# Altium footprint library UP-ROBOT Connectors(2013-02-26).PcbLib: 121 footprints (part 4 of 8)
Each footprint in its own frame and in the unit in brackets; x right, y up, seen from the top. Pads: shape width x height; smd on the part's side, far side on the other; paste and mask are expansions set on the pad; w line width, h text height; cw(c..) or ccw(c..) is an arc to the next point about the centre after c.
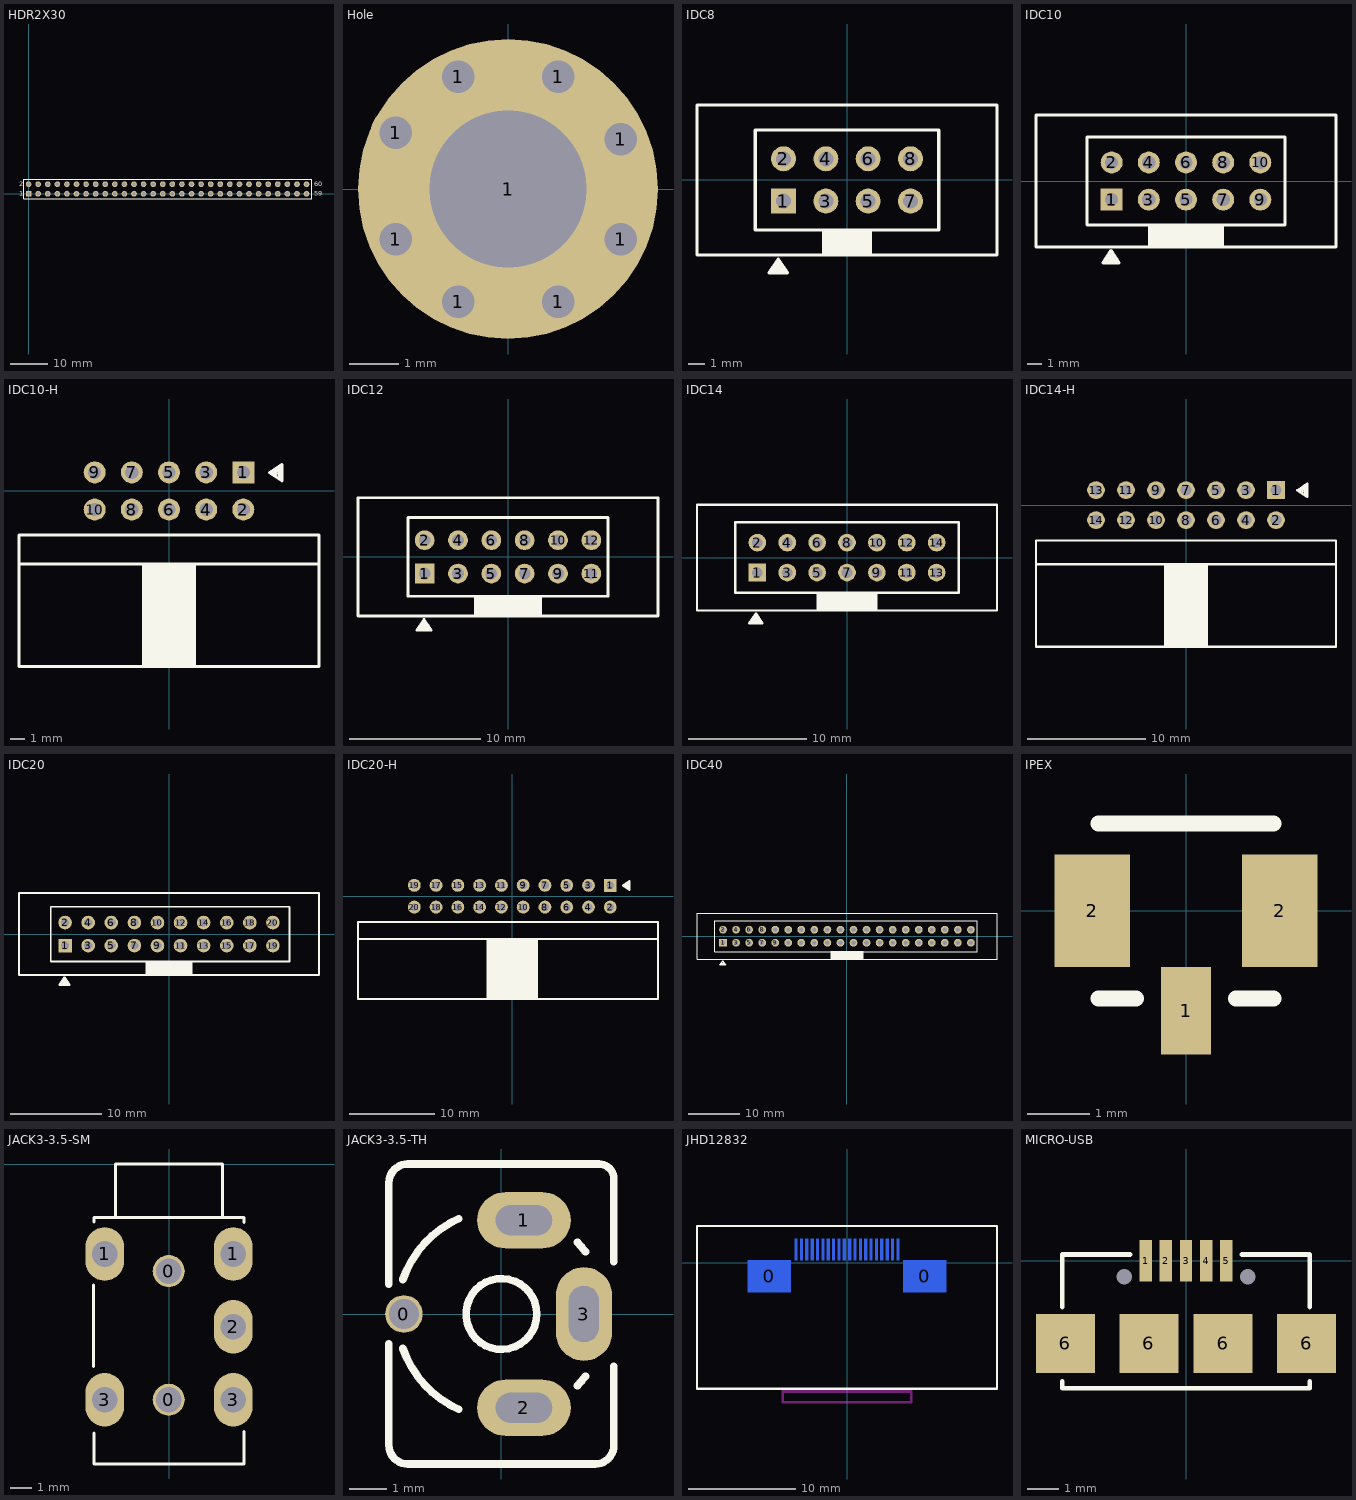
[diagram p3: the footprints below, top view; thin cyan lines are the x and y axes]

## HDR2X30 [mm]
pads (60):
  rect 1.5x1.5 hole 0.9: 1(0,0)
  round 1.5 hole 0.9: 2(0,2.54) 3(2.54,0) 4(2.54,2.54) 5(5.08,0) 6(5.08,2.54) 7(7.62,0) 8(7.62,2.54) 9(10.16,0) 10(10.16,2.54) 11(12.7,0) 12(12.7,2.54) 13(15.24,0) 14(15.24,2.54) 15(17.78,0) 16(17.78,2.54) 17(20.32,0) 18(20.32,2.54) 19(22.86,0) 20(22.86,2.54) 21(25.4,0) 22(25.4,2.54) 23(27.94,0) 24(27.94,2.54) 25(30.48,0) 26(30.48,2.54) 27(33.02,0) 28(33.02,2.54) 29(35.56,0) 30(35.56,2.54) 31(38.1,0) 32(38.1,2.54) 33(40.64,0) 34(40.64,2.54) 35(43.18,0) 36(43.18,2.54) 37(45.72,0) 38(45.72,2.54) 39(48.26,0) 40(48.26,2.54) 41(50.8,0) 42(50.8,2.54) 43(53.34,0) 44(53.34,2.54) 45(55.88,0) 46(55.88,2.54) 47(58.42,0) 48(58.42,2.54) 49(60.96,0) 50(60.96,2.54) 51(63.5,0) 52(63.5,2.54) 53(66.04,0) 54(66.04,2.54) 55(68.58,0) 56(68.58,2.54) 57(71.12,0) 58(71.12,2.54) 59(73.66,0) 60(73.66,2.54)
Top Overlay:
  lines w0.2: -1.27,-1.27 -1.27,3.81 75.06,3.81 75.06,-1.27 -1.27,-1.27
  text "2" at -2.54,2.032 h1.27
  text "1" at -2.54,-0.508 h1.27
  text "59" at 75.692,-0.508 h1.27
  text "60" at 75.692,2.032 h1.27

## Hole [mil]
pads (9):
  round 40 hole 26: 1(-90,-40) 1(-90,45) 1(-40,-90) 1(-40,90) 1(40,-90) 1(40,90) 1(90,-40) 1(90,40)
  round 240 hole 125.98: 1(0,0)

## IDC8 [mm]
pads (8):
  rect 1.5x1.5 hole 0.9: 1(-3.81,-1.27)
  round 1.5 hole 0.9: 2(-3.81,1.27) 3(-1.27,-1.27) 4(-1.27,1.27) 5(1.27,-1.27) 6(1.27,1.27) 7(3.81,-1.27) 8(3.81,1.27)
Top Overlay:
  rectangle: -1.5,-4.5 1.5,-3
  lines w0.203: -4.564,-5.408 -3.694,-5.396 ; -4.426,-5.201 -3.811,-5.22 ; -4.19,-5.209 -4.08,-4.963 ; -4.028,-5.214 -4.125,-4.75 ; -4.125,-4.75 -4.683,-5.587 -3.567,-5.587 -4.125,-4.75 ; -9,-4.5 -2.5,-4.5 2.5,-4.5 9,-4.5 9,4.5 -9,4.5 -9,-4.5 ; -5.5,-3 -5.5,3 5.5,3 5.5,-3 2.5,-3 -2.5,-3 -5.5,-3
3D body: height 8.36, standoff -3.81, extent -8.9,-4.45 8.94,4.55

## IDC10 [mm]
pads (10):
  rect 1.5x1.5 hole 0.9: 1(-5.08,-1.27)
  round 1.5 hole 0.9: 2(-5.08,1.27) 3(-2.54,-1.27) 4(-2.54,1.27) 5(0,-1.27) 6(0,1.27) 7(2.54,-1.27) 8(2.54,1.27) 9(5.08,-1.27) 10(5.08,1.27)
Top Overlay:
  rectangle: -2.5,-4.5 2.5,-3
  lines w0.203: -5.564,-5.408 -4.694,-5.396 ; -5.426,-5.201 -4.811,-5.22 ; -5.19,-5.209 -5.08,-4.963 ; -5.028,-5.214 -5.125,-4.75 ; -5.125,-4.75 -5.683,-5.587 -4.567,-5.587 -5.125,-4.75 ; -2.5,-4.5 -2.5,-3 ; -2.5,-4.5 -10.25,-4.5 -10.25,4.5 10.25,4.5 10.25,-4.5 2.5,-4.5 ; -2.5,-4.5 2.5,-4.5 ; -2.5,-3 -6.75,-3 -6.75,3 6.75,3 6.75,-3 2.5,-3 ; -2.5,-3 2.5,-3 ; 2.5,-4.5 2.5,-3
3D body: height 8.36, standoff -2.2, extent -10.25,-4.5 10.13,4.5

## IDC10-H [mm]
pads (10):
  rect 1.5x1.5 hole 0.9: 1(5.08,1.27)
  round 1.5 hole 0.9: 2(5.08,-1.27) 3(2.54,1.27) 4(2.54,-1.27) 5(0,1.27) 6(0,-1.27) 7(-2.54,1.27) 8(-2.54,-1.27) 9(-5.08,1.27) 10(-5.08,-1.27)
Top Overlay:
  rectangle: -1.75,-12 1.75,-5
  lines w0.203: -10.25,-5 10.25,-5 ; -1.75,-12 -1.75,-5 1.75,-5 1.75,-12 ; 7.088,1.295 7.334,1.185 ; 7.326,0.949 7.345,1.564 ; 7.339,1.347 6.875,1.25 ; 7.521,1.681 7.533,0.811 ; 6.875,1.25 7.712,1.808 7.712,0.692 6.875,1.25 ; -10.25,-12 -10.25,-3 10.25,-3 10.25,-12 0,-12 -10.25,-12
3D body: height 9, standoff -2.41, extent -10.19,-12 10.19,1.6

## IDC12 [mm]
pads (12):
  rect 1.5x1.5 hole 0.9: 1(-6.35,-1.27)
  round 1.5 hole 0.9: 2(-6.35,1.27) 3(-3.81,-1.27) 4(-3.81,1.27) 5(-1.27,-1.27) 6(-1.27,1.27) 7(1.27,-1.27) 8(1.27,1.27) 9(3.81,-1.27) 10(3.81,1.27) 11(6.35,-1.27) 12(6.35,1.27)
Top Overlay:
  rectangle: -2.5,-4.5 2.5,-3
  lines w0.203: -6.834,-5.408 -5.964,-5.396 ; -6.696,-5.201 -6.081,-5.22 ; -6.46,-5.209 -6.35,-4.963 ; -6.298,-5.214 -6.395,-4.75 ; -6.395,-4.75 -5.837,-5.587 -6.953,-5.587 -6.395,-4.75 ; -2.5,-4.5 -2.5,-3 ; -2.5,-4.5 -11.43,-4.5 -11.43,4.5 11.43,4.5 11.43,-4.5 2.5,-4.5 ; -2.5,-4.5 2.5,-4.5 ; -2.5,-3 -7.62,-3 -7.62,3 7.62,3 7.62,-3 2.5,-3 ; -2.5,-3 2.5,-3 ; 2.5,-4.5 2.5,-3
3D body: height 8.36, standoff -2.2, extent -11.45,-4.5 11.47,4.5

## IDC14 [mm]
pads (14):
  rect 1.5x1.5 hole 0.9: 1(-7.62,-1.27)
  round 1.5 hole 0.9: 2(-7.62,1.27) 3(-5.08,-1.27) 4(-5.08,1.27) 5(-2.54,-1.27) 6(-2.54,1.27) 7(0,-1.27) 8(0,1.27) 9(2.54,-1.27) 10(2.54,1.27) 11(5.08,-1.27) 12(5.08,1.27) 13(7.62,-1.27) 14(7.62,1.27)
Top Overlay:
  rectangle: -2.5,-4.5 2.5,-3
  lines w0.203: -8.189,-5.408 -7.319,-5.396 ; -8.051,-5.201 -7.436,-5.22 ; -7.815,-5.209 -7.705,-4.963 ; -7.653,-5.214 -7.75,-4.75 ; -7.75,-4.75 -7.192,-5.587 -8.308,-5.587 -7.75,-4.75 ; -2.5,-4.5 2.5,-4.5 ; -2.5,-4.5 -12.75,-4.5 -12.75,4.5 12.75,4.5 12.75,-4.5 2.5,-4.5 ; -2.5,-4.5 -2.5,-3 ; -2.5,-3 2.5,-3 ; -2.5,-3 -9.5,-3 -9.5,3 9.5,3 9.5,-3 2.5,-3 ; 2.5,-4.5 2.5,-3
3D body: height 10.8, standoff -3.81, extent -12.75,-4.45 12.65,4.55

## IDC14-H [mm]
pads (14):
  rect 1.5x1.5 hole 0.9: 1(7.62,1.27)
  round 1.5 hole 0.9: 2(7.62,-1.27) 3(5.08,1.27) 4(5.08,-1.27) 5(2.54,1.27) 6(2.54,-1.27) 7(0,1.27) 8(0,-1.27) 9(-2.54,1.27) 10(-2.54,-1.27) 11(-5.08,1.27) 12(-5.08,-1.27) 13(-7.62,1.27) 14(-7.62,-1.27)
Top Overlay:
  rectangle: -1.75,-12 1.75,-5
  lines w0.203: -12.7,-5 12.7,-5 ; -1.75,-12 -1.75,-5 1.75,-5 1.75,-12 ; 9.628,1.295 9.874,1.185 ; 9.866,0.949 9.885,1.564 ; 9.879,1.347 9.415,1.25 ; 10.061,1.681 10.073,0.811 ; 9.415,1.25 10.252,0.692 10.252,1.808 9.415,1.25 ; -12.7,-12 -12.7,-3 12.7,-3 12.7,-12 0,-12 -12.7,-12

## IDC20 [mm]
pads (20):
  rect 1.5x1.5 hole 0.9: 1(-11.43,-1.27)
  round 1.5 hole 0.9: 2(-11.43,1.27) 3(-8.89,-1.27) 4(-8.89,1.27) 5(-6.35,-1.27) 6(-6.35,1.27) 7(-3.81,-1.27) 8(-3.81,1.27) 9(-1.27,-1.27) 10(-1.27,1.27) 11(1.27,-1.27) 12(1.27,1.27) 13(3.81,-1.27) 14(3.81,1.27) 15(6.35,-1.27) 16(6.35,1.27) 17(8.89,-1.27) 18(8.89,1.27) 19(11.43,-1.27) 20(11.43,1.27)
Top Overlay:
  rectangle: -2.5,-4.5 2.5,-3
  lines w0.203: -11.939,-5.408 -11.069,-5.396 ; -11.801,-5.201 -11.186,-5.22 ; -11.565,-5.209 -11.455,-4.963 ; -11.411,-5.176 -11.5,-4.75 ; -11.5,-4.75 -10.942,-5.587 -12.058,-5.587 -11.5,-4.75 ; -2.5,-4.5 2.5,-4.5 ; -2.5,-4.5 -16.5,-4.5 -16.5,4.5 16.5,4.5 16.5,-4.5 2.5,-4.5 ; -2.5,-4.5 -2.5,-3 ; -2.5,-3 2.5,-3 ; -2.5,-3 -13,-3 -13,3 13.25,3 13.25,-3 2.5,-3 ; 2.5,-4.5 2.5,-3
3D body: height 8.36, standoff -2.2, extent -16.54,-4.5 16.54,4.5

## IDC20-H [mm]
pads (20):
  rect 1.5x1.5 hole 0.9: 1(11.43,1.27)
  round 1.5 hole 0.9: 2(11.43,-1.27) 3(8.89,1.27) 4(8.89,-1.27) 5(6.35,1.27) 6(6.35,-1.27) 7(3.81,1.27) 8(3.81,-1.27) 9(1.27,1.27) 10(1.27,-1.27) 11(-1.27,1.27) 12(-1.27,-1.27) 13(-3.81,1.27) 14(-3.81,-1.27) 15(-6.35,1.27) 16(-6.35,-1.27) 17(-8.89,1.27) 18(-8.89,-1.27) 19(-11.43,1.27) 20(-11.43,-1.27)
Top Overlay:
  rectangle: -3,-12 3,-5
  lines w0.203: -18,-5 17,-5 ; -1.75,-12 -1.75,-5 1.75,-5 1.75,-12 ; 13.088,1.295 13.334,1.185 ; 13.326,0.949 13.345,1.564 ; 13.339,1.347 12.875,1.25 ; 13.521,1.681 13.533,0.811 ; 12.875,1.25 13.712,1.808 13.712,0.692 12.875,1.25 ; -18,-12 -18,-3 17,-3 17,-12 0,-12 -18,-12

## IDC40 [mm]
pads (40):
  rect 1.5x1.5 hole 0.9: 1(-24.13,-1.27)
  round 1.5 hole 0.9: 2(-24.13,1.27) 3(-21.59,-1.27) 4(-21.59,1.27) 5(-19.05,-1.27) 6(-19.05,1.27) 7(-16.51,-1.27) 8(-16.51,1.27) 9(-13.97,-1.27) 10(-13.97,1.27) 11(-11.43,-1.27) 12(-11.43,1.27) 13(-8.89,-1.27) 14(-8.89,1.27) 15(-6.35,-1.27) 16(-6.35,1.27) 17(-3.81,-1.27) 18(-3.81,1.27) 19(-1.27,-1.27) 20(-1.27,1.27) 21(1.27,-1.27) 22(1.27,1.27) 23(3.81,-1.27) 24(3.81,1.27) 25(6.35,-1.27) 26(6.35,1.27) 27(8.89,-1.27) 28(8.89,1.27) 29(11.43,-1.27) 30(11.43,1.27) 31(13.97,-1.27) 32(13.97,1.27) 33(16.51,-1.27) 34(16.51,1.27) 35(19.05,-1.27) 36(19.05,1.27) 37(21.59,-1.27) 38(21.59,1.27) 39(24.13,-1.27) 40(24.13,1.27)
Top Overlay:
  rectangle: -3.175,-4.421 3.175,-2.921
  lines w0.203: -24.639,-5.408 -23.769,-5.396 ; -24.501,-5.201 -23.886,-5.22 ; -24.265,-5.209 -24.155,-4.963 ; -24.111,-5.176 -24.2,-4.75 ; -24.2,-4.75 -24.758,-5.587 -23.642,-5.587 -24.2,-4.75 ; -29.2,-4.5 -29.2,4.5 29.21,4.5 29.21,-4.5 -10.2,-4.5 -15.2,-4.5 -29.2,-4.5 ; -25.7,-3 -15.2,-3 -10.2,-3 25.4,-3 25.4,3 -25.7,3 -25.7,-3
3D body: height 10.9, standoff -3.71, extent -29.083,-4.445 29.337,4.555

## IPEX [mm]
pads (3):
  rect 0.8x1.4 smd: 1(0,-1.6)
  rect 1.2x1.8 smd: 2(-1.5,0) 2(1.5,0)
Top Overlay:
  lines w0.254: -1.4,-1.4 -0.8,-1.4 ; -1.4,1.4 1.4,1.4 ; 0.8,-1.4 1.4,-1.4
3D body: height 1.3, standoff 0, extent -1.429,-1.24 1.529,1.26

## JACK3-3.5-SM [mm]
pads (7):
  round 1.5 hole 1.2: 0(-0.013,-11) 0(-0.013,-5)
  oval 1.8x2.5 hole 1.2: 1(-3,-4.2) 1(3,-4.2) 2(3,-7.6) 3(-3,-11) 3(3,-11)
Top Overlay:
  lines w0.15: -3.5,-12.55 -3.5,-14 3.5,-14 3.5,-12.5 ; -3.5,-2.7 -3.5,-2.5 ; -2.5,-2.5 -2.5,0 ; 2.5,-2.5 2.5,0 ; 3.5,-2.725 3.5,-2.5
  lines w0.152: -3.525,-9.45 -3.525,-5.65 ; -3.5,-2.5 3.5,-2.5 ; -2.5,0 2.5,0
3D body: height 5.3, standoff -2.7, extent -3.5,-15.2 3.5,0

## JACK3-3.5-TH [mm]
pads (4):
  round 1 hole 0.8: 0(-2.6,0)
  oval 2.5x1.5 hole 0.8 slot 1.5 at 0 deg: 1(0.6,2.5) 2(0.6,-2.5)
  oval 1.5x2.5 hole 0.8 slot 1.5 at 90 deg: 3(2.2,0)
Top Overlay:
  circle w0.203: c0,0 r0.943
  lines w0.203: -3,-0.8 -3,-3.5 ccw(c-2.5,-3.5) -2.5,-4 2.5,-4 ccw(c2.5,-3.5) 3,-3.5 3,-1.4 ; -3,0.8 -3,3.5 cw(c-2.5,3.5) -2.5,4 0,4 2.6,4 cw(c2.6,3.6) 3,3.6 3,1.4 ; -2.632,-0.911 ccw(c0,0) -1.143,-2.54 ; -2.632,0.911 cw(c0,0) -1.143,2.54 ; 2.029,-1.909 ccw(c0,0) 2.24,-1.656 ; 2.029,1.909 cw(c0,0) 2.24,1.656
3D body: height 14.6, standoff -3, extent -3,-4 3,4

## JHD12832 [mm]
pads (22):
  rect 4x3 smd far side: 0(-7.25,-1.25) 0(7.25,-1.25)
  rect 0.25x2 smd far side: 1(-4.75,1.25) 2(-4.25,1.25) 3(-3.75,1.25) 4(-3.25,1.25) 5(-2.75,1.25) 6(-2.25,1.25) 7(-1.75,1.25) 8(-1.25,1.25) 9(-0.75,1.25) 10(-0.25,1.25) 11(0.25,1.25) 12(0.75,1.25) 13(1.25,1.25) 14(1.75,1.25) 15(2.25,1.25) 16(2.75,1.25) 17(3.25,1.25) 18(3.75,1.25) 19(4.25,1.25) 20(4.75,1.25)
Top Overlay:
  lines w0.2: -14,-11.75 14,-11.75 14,3.45 -14,3.45 -14,-11.75
Bottom Overlay:
  lines w0.254: -5.5,-12 -5.5,-3 ; 5.5,-12 5.5,-3
Keep-Out Layer:
  lines w0.254: -6,-13 -6,-12 6,-12 6,-13 -6,-13

## MICRO-USB [mm]
pads (11):
  rect 0.4x1.35 smd: 1(-1.3,0) 2(-0.65,0) 3(0,0) 4(0.65,0) 5(1.3,0)
  rect 1.9x1.9 smd: 6(-3.9,-2.675) 6(-1.2,-2.675) 6(1.2,-2.675) 6(3.9,-2.675)
  round 0 hole 0.5: 7(-2,-0.525) 7(2,-0.525)
Top Overlay:
  lines w0.152: -4,-3.9 -4,-4.125 4,-4.125 4,-3.9 ; -4,-1.5 -4,0.2 -1.8,0.2 ; 1.8,0.2 4,0.2 4,-1.5
3D body: height 2.71, standoff -0.23, extent -3.99,-5.23 3.99,0.2